# Altium footprint library Atlan.PcbLib: 283 footprints (part 9 of 18)
Each footprint in its own frame and in the unit in brackets; x right, y up, seen from the top. Pads: shape width x height; smd on the part's side, far side on the other; paste and mask are expansions set on the pad; w line width, h text height; cw(c..) or ccw(c..) is an arc to the next point about the centre after c.
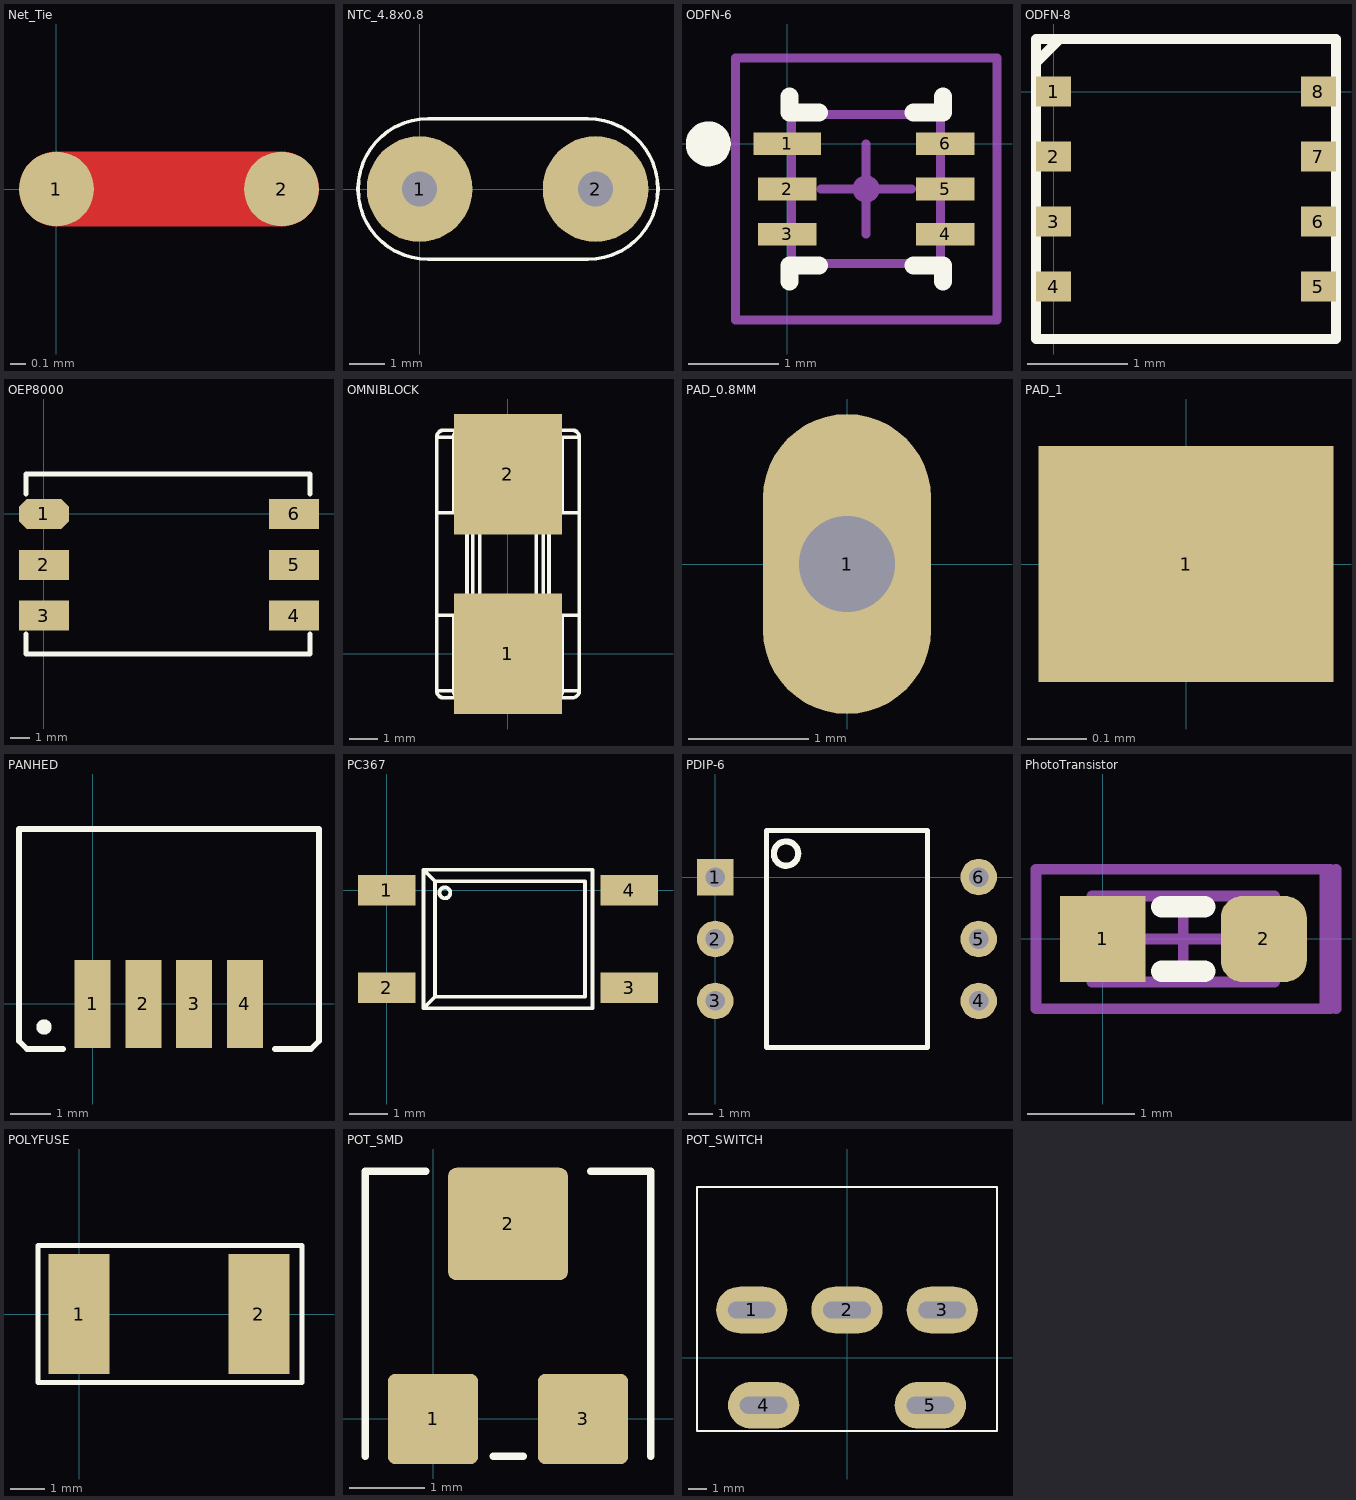
[diagram p8: the footprints below, top view; thin cyan lines are the x and y axes]

## Net_Tie [mm]
pads (2):
  round 0.5 smd: 1(0,0) 2(1.5,0)
Top Layer:
  lines w0.5: 0,0 1.5,0

## NTC_4.8x0.8 [mm]
pads (2):
  round 3 hole 1: 1(0,0) 2(5,0)
Top Overlay:
  lines w0.1: -1.75,0 ccw(c0.25,0) 0.25,-2 4.775,-2 ccw(c4.775,0) 6.775,0 ccw(c4.775,0) 4.775,2 0.25,2 ccw(c0.25,0) -1.75,0
3D body: height 5.38, standoff 0.6, extent 0.105,-1.5 4.895,1.5

## ODFN-6 [mm]
height 0.7
pads (6):
  rect 0.75x0.25 smd: 1(0,0)
  rect 0.65x0.25 smd: 2(0,-0.5) 3(0,-1) 4(1.75,-1) 5(1.75,-0.5) 6(1.75,0)
Top Overlay:
  circle w0.25: c-0.875,0 r0.125
  lines w0.2: 0.025,-1.525 0.025,-1.35 0.35,-1.35 ; 0.025,0.525 0.025,0.35 0.35,0.35 ; 1.4,-1.35 1.725,-1.35 1.725,-1.525 ; 1.4,0.35 1.725,0.35 1.725,0.525
Mechanical 13:
  circle w0.1: c0.875,-0.5 r0.1
  lines w0.1: 0.05,-1.325 0.05,0.325 1.7,0.325 1.7,-1.325 0.05,-1.325
Mechanical 15:
  lines w0.1: 0.375,-0.5 1.375,-0.5 ; 0.875,-1 0.875,0 ; -0.575,-1.95 -0.575,0.95 2.325,0.95 2.325,-1.95 -0.575,-1.95
3D body: height 0.7, standoff 0.05, extent 0.05,-1.325 1.7,0.325

## ODFN-8 [mm]
pads (8):
  rect 0.35x0.3 smd: 1(0,0) 2(0,-0.65) 3(0,-1.3) 4(0,-1.95) 5(2.65,-1.95) 6(2.65,-1.3) 7(2.65,-0.65) 8(2.65,0)
Top Overlay:
  lines w0.1: -0.175,0.318 -0.144,0.318 0.064,0.525 ; -0.175,-2.475 -0.175,0.525 2.825,0.525 2.825,-2.475 -0.175,-2.475

## OEP8000 [mm]
pads (6):
  oct 2.5x1.5 smd: 1(0,0)
  rect 2.5x1.5 smd: 2(0,-2.54) 3(0,-5.08) 4(12.5,-5.08) 5(12.5,-2.54) 6(12.5,0)
Top Overlay:
  lines w0.25: -0.9,-6 -0.9,-7 13.3,-7 13.3,-6 ; -0.9,1 -0.9,2 13.3,2 13.3,1
3D body: height 7.3, standoff 0, extent -0.9,-7 13.3,2

## OMNIBLOCK [mm]
pads (2):
  rect 3.81x4.24 smd: 1(0,0) 2(0,6.33)
Top Overlay:
  lines w0.127: -2.515,1.365 -1.445,1.365 -1.445,4.965 -2.515,4.965 ; -1.918,1.365 -1.918,-1.3 ccw(c-1.675,-1.307) -1.683,-1.55 ; -1.918,4.965 -1.918,7.63 cw(c-1.675,7.637) -1.683,7.88 ; -1.447,-1.55 -1.447,1.365 ; -1.447,4.965 -1.447,7.88 ; -1.245,1.565 -1.245,4.765 ; -0.995,1.565 -0.995,4.765 ; 0.995,1.565 0.995,4.765 ; 1.245,1.565 1.245,4.765 ; 1.445,1.365 2.515,1.365 ; 1.447,-1.55 1.447,1.365 ; 1.447,4.965 1.447,7.88 ; 1.683,-1.55 ccw(c1.675,-1.307) 1.918,-1.3 1.918,1.365 ; 1.918,4.965 1.918,7.63 ; 2.515,4.965 1.445,4.965 ; -2.515,-1.3 ccw(c-2.265,-1.3) -2.265,-1.55 2.265,-1.55 ccw(c2.265,-1.3) 2.515,-1.3 ; -2.515,-1.3 2.515,-1.3 ; -2.515,-1.3 -2.515,7.63 ; -2.515,7.63 cw(c-2.265,7.63) -2.265,7.88 2.265,7.88 cw(c2.265,7.63) 2.515,7.63 ; -2.515,7.63 2.515,7.63 ; 1.445,4.765 1.445,0.015 -1.445,0.015 -1.445,6.315 1.445,6.315 1.445,4.965 ; 1.445,4.765 1.445,4.965 ; 1.445,4.765 1.445,4.765 ; 2.515,-1.3 2.515,7.63 ; -1.345,0.115 -1.345,1.565 1.345,1.565 1.345,0.115 -1.345,0.115 ; -1.345,4.765 1.345,4.765 1.345,6.215 -1.345,6.215 -1.345,4.765
3D body "SW3dPS-OMNI-BLOK littelfuse.STEP": height 3.81, standoff 0, extent -2.515,-1.55 2.515,8.28

## PAD_0.8MM [mm]
pads (1):
  oval 1.4x2.5 hole 0.8 mask+0.04: 1(0,0)

## PAD_1 [mm]
height 1.75
pads (1):
  rect 0.5x0.4 smd: 1(0,0)

## PANHED [mm]
pads (4):
  rect 0.9x2.2 smd: 1(0,0) 2(1.27,0) 3(2.54,0) 4(3.81,0)
Top Overlay:
  circle w0.2: c-1.215,-0.575 r0.09
  lines w0.14: -0.74,-1.125 -1.64,-1.125 -1.84,-0.925 -1.84,4.375 5.66,4.375 5.66,-0.925 5.46,-1.125 4.56,-1.125
3D body: height 4, standoff 0, extent -1.84,-0.925 5.66,4.375

## PC367 [mm] "Optocoupler"
height 2.6
pads (4):
  rect 1.5x0.8 smd: 1(0,0) 2(0,-2.54) 3(6.3,-2.54) 4(6.3,0)
Top Overlay:
  circle w0.1: c1.509,-0.07 r0.141
  lines w0.1: 0.95,-3.07 1.25,-2.77 ; 0.95,-3.07 0.95,0.53 ; 0.95,-3.07 5.35,-3.07 5.35,0.53 0.95,0.53 ; 0.95,0.53 1.25,0.23 ; 0.95,0.53 0.95,0.53 ; 1.25,-2.77 5.15,-2.77 ; 1.25,-2.77 1.25,0.23 ; 1.25,0.23 5.15,0.23 5.15,-2.77 ; 5.15,-2.77 5.15,-2.77
3D body: height 2.6, standoff 0, extent 0.95,-3.07 5.35,0.53

## PCBComponent_1 [mm]

## PDIP-6 [mm]
pads (6):
  rect 1.5x1.5 hole 0.8: 1(0,0)
  round 1.5 hole 0.8: 2(0,-2.54) 3(0,-5.08) 4(10.8,-5.08) 5(10.8,-2.54) 6(10.8,0)
Top Overlay:
  circle w0.254: c2.9,0.96 r0.5
  lines w0.2: 2.1,-6.99 2.1,1.91 8.7,1.91 8.7,-6.99 2.1,-6.99
3D body: height 3, standoff 0, extent 2.1,-7.04 8.7,1.86

## PhotoTransistor [mm] "PhotoTransistor, 2-Leads, Body 1,7x0,8mm, IPC Medium Density"
height 0.6
pads (2):
  rect 0.8x0.8 smd: 1(0,0)
  rrect50% 0.8x0.8 smd: 2(1.5,0)
Top Overlay:
  lines w0.2: 0.55,-0.3 0.95,-0.3 ; 0.55,0.3 0.95,0.3
Mechanical 13:
  lines w0.1: -0.1,-0.4 1.6,-0.4 1.6,0.4 -0.1,0.4 -0.1,-0.4
Mechanical 15:
  lines w0.1: 0.35,0 1.15,0 ; 0.75,-0.4 0.75,0.4 ; 2.071,-0.65 2.071,0.65 ; 2.172,-0.65 2.172,0.65 ; -0.622,-0.65 2.122,-0.65 2.122,0.65 -0.622,0.65 -0.622,-0.65
3D body: height 0.6, standoff 0, extent -0.1,-0.4 1.6,0.4

## POLYFUSE [mm]
pads (2):
  rect 1.78x3.5 smd mask+0.02: 1(0,0) 2(5.25,0)
Top Overlay:
  lines w0.15: -1.2,-2 6.5,-2 6.5,2 -1,2 -1.1,2 -1.2,2 -1.2,-2

## POT_SMD [mm]
pads (3):
  rrect15% 1.2x1.2 smd: 1(0,0) 3(2,0)
  rrect15% 1.6x1.5 smd: 2(1,2.6)
Top Overlay:
  lines w0.1: -0.9,-0.5 -0.9,3.3 -0.1,3.3 ; 0.8,-0.5 1.2,-0.5 ; 2.1,3.3 2.9,3.3 2.9,-0.5

## POT_SWITCH [mm]
pads (5):
  oval 3.8x2.5 hole 0.9 slot 2.54 at 0 deg mask+0.04: 1(-5.08,2.54) 2(0,2.54) 3(5.08,2.54) 4(-4.445,-2.54) 5(4.445,-2.54)
Top Overlay:
  lines w0.1: -8.001,-3.912 -8.001,9.093 8.001,9.093 8.001,-3.912 -8.001,-3.912
3D body: height 18.6, standoff 0, extent -8,-4.01 8,9.09
3D body: height 15.6, standoff 5.6, extent -5,9.09 5,17.39
3D body: height 13.6, standoff 7.6, extent -3,17.39 3,27.39